# Altium footprint library Wurth_Elektronik_Electromechanic_Wire_to_Board_Connectors_rev16a.PCBLIB: 662 footprints (part 6 of 42)
Each footprint in its own frame and in the unit in brackets; x right, y up, seen from the top. Pads: shape width x height; smd on the part's side, far side on the other; paste and mask are expansions set on the pad; w line width, h text height; cw(c..) or ccw(c..) is an arc to the next point about the centre after c.
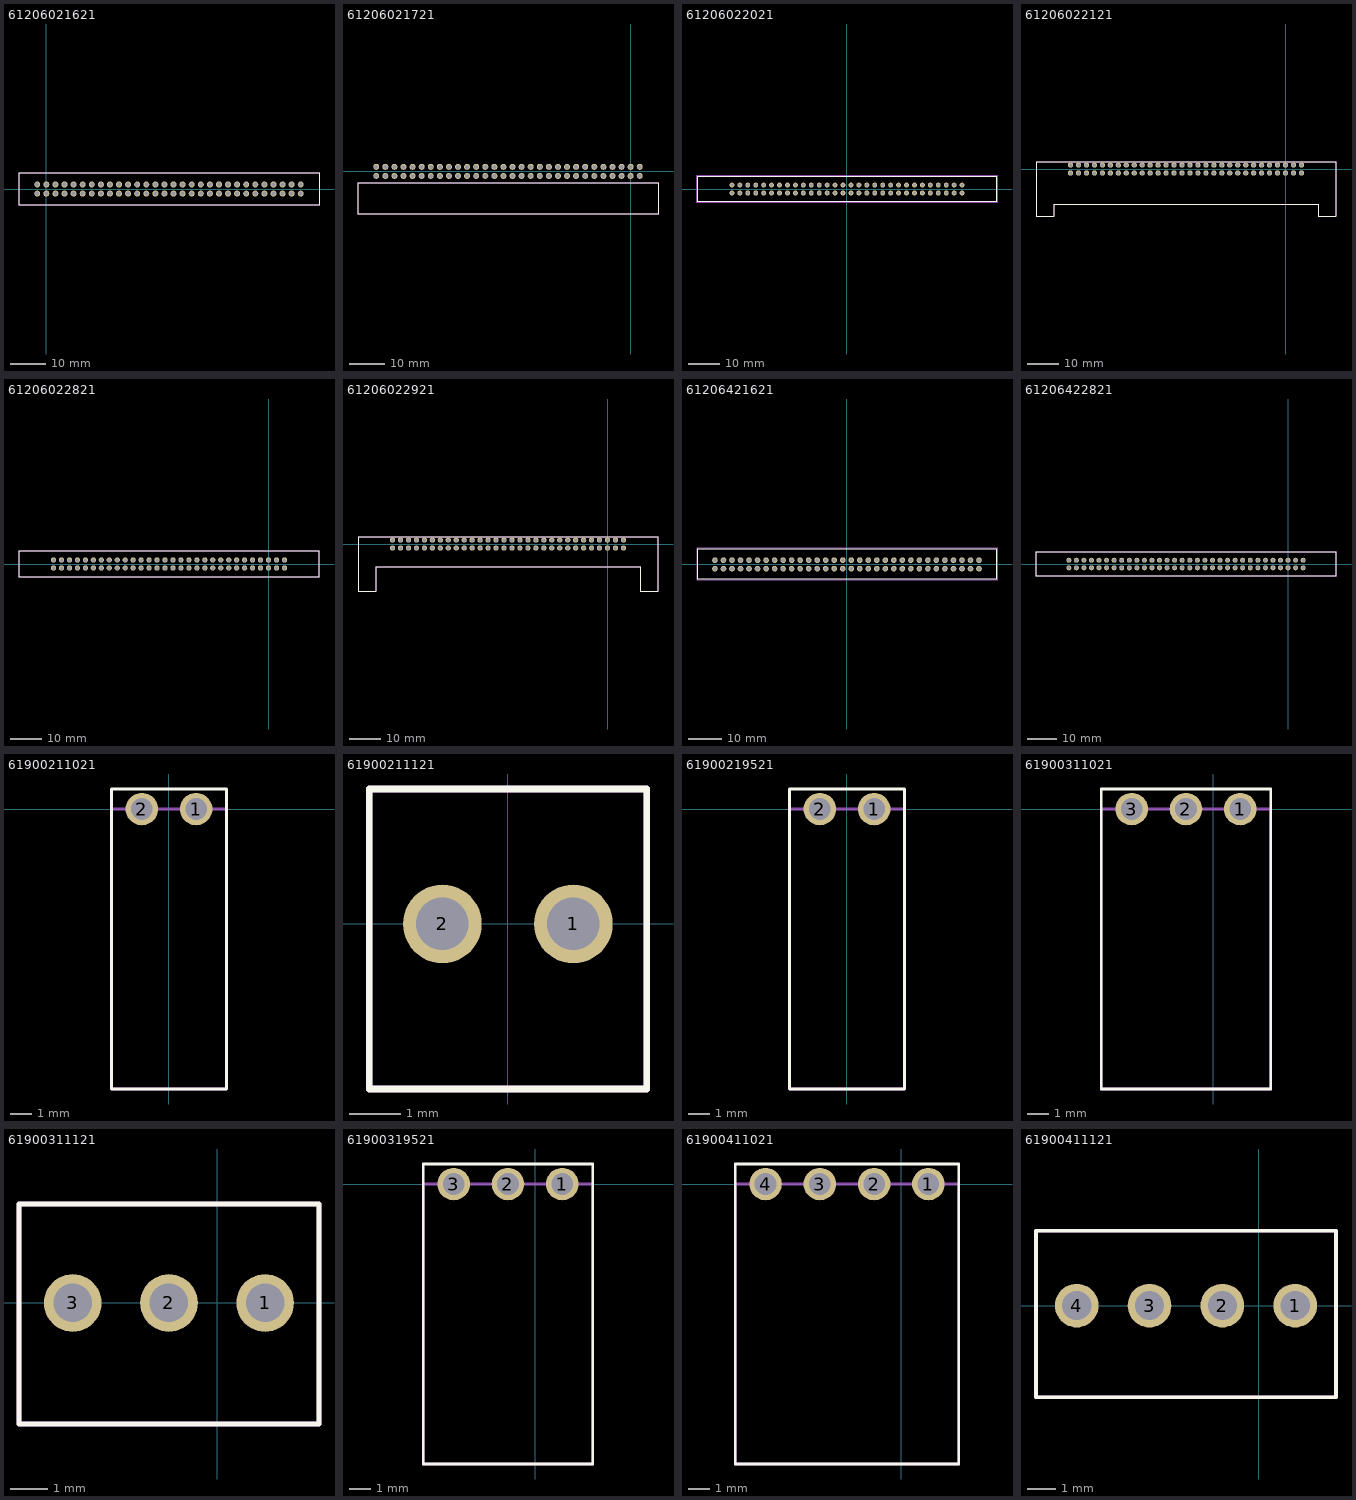
[diagram p5: the footprints below, top view; thin cyan lines are the x and y axes]

## 61206021621 [mil]
pads (60):
  round 66 hole 44: 1(-100,-50) 2(-100,50) 3(0,-50) 4(0,50) 5(100,-50) 6(100,50) 7(200,-50) 8(200,50) 9(300,-50) 10(300,50) 11(400,-50) 12(400,50) 13(500,-50) 14(500,50) 15(600,-50) 16(600,50) 17(700,-50) 18(700,50) 19(800,-50) 20(800,50) 21(900,-50) 22(900,50) 23(1000,-50) 24(1000,50) 25(1100,-50) 26(1100,50) 27(1200,-50) 28(1200,50) 29(1300,-50) 30(1300,50) 31(1400,-50) 32(1400,50) 33(1500,-50) 34(1500,50) 35(1600,-50) 36(1600,50) 37(1700,-50) 38(1700,50) 39(1800,-50) 40(1800,50) 41(1900,-50) 42(1900,50) 43(2000,-50) 44(2000,50) 45(2100,-50) 46(2100,50) 47(2200,-50) 48(2200,50) 49(2300,-50) 50(2300,50) 51(2400,-50) 52(2400,50) 53(2500,-50) 54(2500,50) 55(2600,-50) 56(2600,50) 57(2700,-50) 58(2700,50) 59(2800,-50) 60(2800,50)
Top Overlay:
  lines w5: -300.79,-179.13 3001,-179.13 3001,180 -300.79,180 -300.79,-179.13
Mechanical 2:
  text ">NAME" at 1350,200 h77.5
Mechanical 4:
  text ">VALUE" at 1325,-250 h77.5
Mechanical 16:
  lines w5: -300.79,-179.13 3001,-179.13 3001,180 -300.79,180 -300.79,-179.13
  text "1" at -125,-75 h77.5
  text "60" at 2757,22 h77.5

## 61206021721 [mil]
pads (60):
  round 66 hole 44: 1(100,50) 2(100,-50) 3(0,50) 4(0,-50) 5(-100,50) 6(-100,-50) 7(-200,50) 8(-200,-50) 9(-300,50) 10(-300,-50) 11(-400,50) 12(-400,-50) 13(-500,50) 14(-500,-50) 15(-600,50) 16(-600,-50) 17(-700,50) 18(-700,-50) 19(-800,50) 20(-800,-50) 21(-900,50) 22(-900,-50) 23(-1000,50) 24(-1000,-50) 25(-1100,50) 26(-1100,-50) 27(-1200,50) 28(-1200,-50) 29(-1300,50) 30(-1300,-50) 31(-1400,50) 32(-1400,-50) 33(-1500,50) 34(-1500,-50) 35(-1600,50) 36(-1600,-50) 37(-1700,50) 38(-1700,-50) 39(-1800,50) 40(-1800,-50) 41(-1900,50) 42(-1900,-50) 43(-2000,50) 44(-2000,-50) 45(-2100,50) 46(-2100,-50) 47(-2200,50) 48(-2200,-50) 49(-2300,50) 50(-2300,-50) 51(-2400,50) 52(-2400,-50) 53(-2500,50) 54(-2500,-50) 55(-2600,50) 56(-2600,-50) 57(-2700,50) 58(-2700,-50) 59(-2800,50) 60(-2800,-50)
Top Overlay:
  lines w5: -3000.79,-470.87 301,-470.87 301,-122.44 -3000.79,-122.44 -3000.79,-470.87
Mechanical 2:
  text ">NAME" at 357,-250.7 h77.5
Mechanical 4:
  text ">VALUE" at 357,-348.7 h77.5
Mechanical 16:
  lines w5: -3000.79,-470.87 301,-470.87 301,-122.44 -3000.79,-122.44 -3000.79,-470.87
  text "1" at 75,25 h77.5
  text "60" at -2825,-75 h77.5

## 61206022021 [mil]
pads (60):
  round 61.5 hole 41: 1(1450,50) 2(1450,-50) 3(1350,50) 4(1350,-50) 5(1250,50) 6(1250,-50) 7(1150,50) 8(1150,-50) 9(1050,50) 10(1050,-50) 11(950,50) 12(950,-50) 13(850,50) 14(850,-50) 15(750,50) 16(750,-50) 17(650,50) 18(650,-50) 19(550,50) 20(550,-50) 21(450,50) 22(450,-50) 23(350,50) 24(350,-50) 25(250,50) 26(250,-50) 27(150,50) 28(150,-50) 29(50,50) 30(50,-50) 31(-50,50) 32(-50,-50) 33(-150,50) 34(-150,-50) 35(-250,50) 36(-250,-50) 37(-350,50) 38(-350,-50) 39(-450,50) 40(-450,-50) 41(-550,50) 42(-550,-50) 43(-650,50) 44(-650,-50) 45(-750,50) 46(-750,-50) 47(-850,50) 48(-850,-50) 49(-950,50) 50(-950,-50) 51(-1050,50) 52(-1050,-50) 53(-1150,50) 54(-1150,-50) 55(-1250,50) 56(-1250,-50) 57(-1350,50) 58(-1350,-50) 59(-1450,50) 60(-1450,-50)
Top Overlay:
  lines w5: -1879.92,-163.39 1880,-163.39 1880,164 -1879.92,164 -1879.92,-163.39
Mechanical 2:
  text ">NAME" at 50,200 h77.5
Mechanical 4:
  text ">VALUE" at 50,-250 h77.5
Mechanical 16:
  text "1" at 1425,25 h77.5
  text "60" at -1500,-75 h77.5
  text "2" at 1425,-75 h77.5
Mechanical 27:
  lines w5: -1889.76,-173.23 1890,-173.23 1890,174 -1889.76,174 -1889.76,-173.23

## 61206022121 [mil]
pads (60):
  round 66 hole 44: 1(200,50) 2(200,-50) 3(100,50) 4(100,-50) 5(0,50) 6(0,-50) 7(-100,50) 8(-100,-50) 9(-200,50) 10(-200,-50) 11(-300,50) 12(-300,-50) 13(-400,50) 14(-400,-50) 15(-500,50) 16(-500,-50) 17(-600,50) 18(-600,-50) 19(-700,50) 20(-700,-50) 21(-800,50) 22(-800,-50) 23(-900,50) 24(-900,-50) 25(-1000,50) 26(-1000,-50) 27(-1100,50) 28(-1100,-50) 29(-1200,50) 30(-1200,-50) 31(-1300,50) 32(-1300,-50) 33(-1400,50) 34(-1400,-50) 35(-1500,50) 36(-1500,-50) 37(-1600,50) 38(-1600,-50) 39(-1700,50) 40(-1700,-50) 41(-1800,50) 42(-1800,-50) 43(-1900,50) 44(-1900,-50) 45(-2000,50) 46(-2000,-50) 47(-2100,50) 48(-2100,-50) 49(-2200,50) 50(-2200,-50) 51(-2300,50) 52(-2300,-50) 53(-2400,50) 54(-2400,-50) 55(-2500,50) 56(-2500,-50) 57(-2600,50) 58(-2600,-50) 59(-2700,50) 60(-2700,-50)
Top Overlay:
  lines w5: -3133.86,-590.55 -3133.86,90 634,90 634,-590.55 410,-590.55 410,-440.94 -2909.45,-440.94 -2909.45,-590.55 -3133.86,-590.55
Mechanical 2:
  text ">NAME" at -1200,125 h77.5
Mechanical 4:
  text ">VALUE" at -1211.81,-614.57 h77.5
Mechanical 16:
  lines w5: -3133.86,-590.55 -2909.45,-590.55 -2909.45,-440.94 410,-440.94 410,-590.55 634,-590.55 634,90 -3133.86,90 -3133.86,-590.55
  text "1" at 175,25 h77.5
  text "60" at -2725,-75 h77.5

## 61206022821 [mil]
pads (60):
  round 66 hole 44: 1(200,50) 2(200,-50) 3(100,50) 4(100,-50) 5(0,50) 6(0,-50) 7(-100,50) 8(-100,-50) 9(-200,50) 10(-200,-50) 11(-300,50) 12(-300,-50) 13(-400,50) 14(-400,-50) 15(-500,50) 16(-500,-50) 17(-600,50) 18(-600,-50) 19(-700,50) 20(-700,-50) 21(-800,50) 22(-800,-50) 23(-900,50) 24(-900,-50) 25(-1000,50) 26(-1000,-50) 27(-1100,50) 28(-1100,-50) 29(-1200,50) 30(-1200,-50) 31(-1300,50) 32(-1300,-50) 33(-1400,50) 34(-1400,-50) 35(-1500,50) 36(-1500,-50) 37(-1600,50) 38(-1600,-50) 39(-1700,50) 40(-1700,-50) 41(-1800,50) 42(-1800,-50) 43(-1900,50) 44(-1900,-50) 45(-2000,50) 46(-2000,-50) 47(-2100,50) 48(-2100,-50) 49(-2200,50) 50(-2200,-50) 51(-2300,50) 52(-2300,-50) 53(-2400,50) 54(-2400,-50) 55(-2500,50) 56(-2500,-50) 57(-2600,50) 58(-2600,-50) 59(-2700,50) 60(-2700,-50)
Top Overlay:
  lines w5: -3133.86,-163.39 634,-163.39 634,164 -3133.86,164 -3133.86,-163.39
Mechanical 2:
  text ">NAME" at -1200,200 h77.5
Mechanical 4:
  text ">VALUE" at -1200,-250 h77.5
Mechanical 16:
  lines w5: -3133.86,-163.39 634,-163.39 634,164 -3133.86,164 -3133.86,-163.39
  text "1" at 175,25 h77.5
  text "60" at -2750,-75 h77.5

## 61206022921 [mil]
pads (60):
  round 66 hole 44: 1(200,50) 2(200,-50) 3(100,50) 4(100,-50) 5(0,50) 6(0,-50) 7(-100,50) 8(-100,-50) 9(-200,50) 10(-200,-50) 11(-300,50) 12(-300,-50) 13(-400,50) 14(-400,-50) 15(-500,50) 16(-500,-50) 17(-600,50) 18(-600,-50) 19(-700,50) 20(-700,-50) 21(-800,50) 22(-800,-50) 23(-900,50) 24(-900,-50) 25(-1000,50) 26(-1000,-50) 27(-1100,50) 28(-1100,-50) 29(-1200,50) 30(-1200,-50) 31(-1300,50) 32(-1300,-50) 33(-1400,50) 34(-1400,-50) 35(-1500,50) 36(-1500,-50) 37(-1600,50) 38(-1600,-50) 39(-1700,50) 40(-1700,-50) 41(-1800,50) 42(-1800,-50) 43(-1900,50) 44(-1900,-50) 45(-2000,50) 46(-2000,-50) 47(-2100,50) 48(-2100,-50) 49(-2200,50) 50(-2200,-50) 51(-2300,50) 52(-2300,-50) 53(-2400,50) 54(-2400,-50) 55(-2500,50) 56(-2500,-50) 57(-2600,50) 58(-2600,-50) 59(-2700,50) 60(-2700,-50)
Top Overlay:
  lines w5: -3133.86,-590.16 -3133.86,90 634,90 634,-590.16 410,-590.16 410,-283.46 -2909.45,-283.46 -2909.45,-590.16 -3133.86,-590.16
Mechanical 2:
  text ">NAME" at -1200,125 h77.5
Mechanical 4:
  text ">VALUE" at -1211.81,-457.09 h77.5
Mechanical 16:
  lines w5: -3133.86,-590.16 -2909.45,-590.16 -2909.45,-283.46 410,-283.46 410,-590.16 634,-590.16 634,90 -3133.86,90 -3133.86,-590.16
  text "1" at 175,25 h77.5
  text "60" at -2725,-75 h77.5

## 61206421621 [mil]
pads (64):
  round 66 hole 44: 1(-1550,-50) 2(-1550,50) 3(-1450,-50) 4(-1450,50) 5(-1350,-50) 6(-1350,50) 7(-1250,-50) 8(-1250,50) 9(-1150,-50) 10(-1150,50) 11(-1050,-50) 12(-1050,50) 13(-950,-50) 14(-950,50) 15(-850,-50) 16(-850,50) 17(-750,-50) 18(-750,50) 19(-650,-50) 20(-650,50) 21(-550,-50) 22(-550,50) 23(-450,-50) 24(-450,50) 25(-350,-50) 26(-350,50) 27(-250,-50) 28(-250,50) 29(-150,-50) 30(-150,50) 31(-50,-50) 32(-50,50) 33(50,-50) 34(50,50) 35(150,-50) 36(150,50) 37(250,-50) 38(250,50) 39(350,-50) 40(350,50) 41(450,-50) 42(450,50) 43(550,-50) 44(550,50) 45(650,-50) 46(650,50) 47(750,-50) 48(750,50) 49(850,-50) 50(850,50) 51(950,-50) 52(950,50) 53(1050,-50) 54(1050,50) 55(1150,-50) 56(1150,50) 57(1250,-50) 58(1250,50) 59(1350,-50) 60(1350,50) 61(1450,-50) 62(1450,50) 63(1550,-50) 64(1550,50)
Top Overlay:
  lines w5: -1750.79,-174.21 -1750.79,185 1751,185 1751,-174.21 -1750.79,-174.21
Mechanical 2:
  text ">NAME" at -1750.79,205 h77.5
Mechanical 4:
  text ">VALUE" at -1750.79,-244.21 h77.5
Mechanical 27:
  lines w5: -1760.63,-184.06 -1760.63,194 1761,194 1761,-184.06 -1760.63,-184.06

## 61206422821 [mil]
pads (64):
  round 66 hole 44: 1(200,50) 2(200,-50) 3(100,50) 4(100,-50) 5(0,50) 6(0,-50) 7(-100,50) 8(-100,-50) 9(-200,50) 10(-200,-50) 11(-300,50) 12(-300,-50) 13(-400,50) 14(-400,-50) 15(-500,50) 16(-500,-50) 17(-600,50) 18(-600,-50) 19(-700,50) 20(-700,-50) 21(-800,50) 22(-800,-50) 23(-900,50) 24(-900,-50) 25(-1000,50) 26(-1000,-50) 27(-1100,50) 28(-1100,-50) 29(-1200,50) 30(-1200,-50) 31(-1300,50) 32(-1300,-50) 33(-1400,50) 34(-1400,-50) 35(-1500,50) 36(-1500,-50) 37(-1600,50) 38(-1600,-50) 39(-1700,50) 40(-1700,-50) 41(-1800,50) 42(-1800,-50) 43(-1900,50) 44(-1900,-50) 45(-2000,50) 46(-2000,-50) 47(-2100,50) 48(-2100,-50) 49(-2200,50) 50(-2200,-50) 51(-2300,50) 52(-2300,-50) 53(-2400,50) 54(-2400,-50) 55(-2500,50) 56(-2500,-50) 57(-2600,50) 58(-2600,-50) 59(-2700,50) 60(-2700,-50) 61(-2800,50) 62(-2800,-50) 63(-2900,50) 64(-2900,-50)
Top Overlay:
  lines w5: -3333.86,-163.39 634,-163.39 634,164 -3333.86,164 -3333.86,-163.39
Mechanical 2:
  text ">NAME" at -1200,200 h77.5
Mechanical 4:
  text ">VALUE" at -1200,-250 h77.5
Mechanical 16:
  lines w5: -3333.86,-163.39 634,-163.39 634,164 -3333.86,164 -3333.86,-163.39
  text "1" at 175,25 h77.5
  text "64" at -2925,-75 h77.5

## 61900211021 [mil]
pads (2):
  round 60 hole 40: 1(50,0) 2(-50,0)
Top Overlay:
  lines w5: -105.91,-515.75 106,-515.75 106,37 -105.91,37 -105.91,-515.75
Mechanical 2:
  text ">NAME" at 189,-238.19 h77.5
Mechanical 4:
  text ">VALUE" at 198,-316.14 h77.5
Mechanical 16:
  lines w5: -105.91,-515.75 -105.91,0 106,0 106,-515.75 -105.91,-515.75
  text "1" at 25,-25 h77.5
  text "2" at -75,-25 h77.5

## 61900211121 [mil]
pads (2):
  round 60 hole 40: 1(50,0) 2(-50,0)
Top Overlay:
  lines w5: -105.91,-125.98 106,-125.98 106,103 -105.91,103 -105.91,-125.98
Mechanical 2:
  text ">NAME" at 139,12 h77.5
Mechanical 4:
  text ">VALUE" at 148,-66.14 h77.5
Mechanical 16:
  lines w5: -105.91,-125.98 -105.91,103 106,103 106,-125.98 -105.91,-125.98
  text "1" at 28,-23.62 h77.5
  text "2" at -70.87,-23.62 h77.5

## 61900219521 [mil]
pads (2):
  round 60 hole 40: 1(50,0) 2(-50,0)
Top Overlay:
  lines w5: -105.91,-515.75 106,-515.75 106,37 -105.91,37 -105.91,-515.75
Mechanical 2:
  text ">NAME" at 189,-238.19 h77.5
Mechanical 4:
  text ">VALUE" at 198,-316.14 h77.5
Mechanical 16:
  lines w5: -105.91,-515.75 -105.91,0 106,0 106,-515.75 -105.91,-515.75
  text "1" at 25,-25 h77.5
  text "2" at -75,-25 h77.5

## 61900311021 [mil]
pads (3):
  round 60 hole 40: 1(50,0) 2(-50,0) 3(-150,0)
Top Overlay:
  lines w5: -205.91,-515.75 106,-515.75 106,37 -205.91,37 -205.91,-515.75
Mechanical 2:
  text ">NAME" at 189,-238.19 h77.5
Mechanical 4:
  text ">VALUE" at 198,-316.14 h77.5
Mechanical 16:
  lines w5: -205.91,-515.75 -205.91,0 106,0 106,-515.75 -205.91,-515.75
  text "1" at 25,-25 h77.5
  text "3" at -175,-25 h77.5

## 61900311121 [mil]
pads (3):
  round 60 hole 40: 1(50,0) 2(-50,0) 3(-150,0)
Top Overlay:
  lines w5: -205.91,-125.98 106,-125.98 106,103 -205.91,103 -205.91,-125.98
Mechanical 2:
  text ">NAME" at 139,12 h77.5
Mechanical 4:
  text ">VALUE" at 148,-66.14 h77.5
Mechanical 16:
  lines w5: -205.91,-125.98 -205.91,103 106,103 106,-125.98 -205.91,-125.98
  text "1" at 28,-23.62 h77.5
  text "3" at -169.29,-23.62 h77.5

## 61900319521 [mil]
pads (3):
  round 60 hole 40: 1(50,0) 2(-50,0) 3(-150,0)
Top Overlay:
  lines w5: -205.91,-515.75 106,-515.75 106,37 -205.91,37 -205.91,-515.75
Mechanical 2:
  text ">NAME" at 189,-238.19 h77.5
Mechanical 4:
  text ">VALUE" at 198,-316.14 h77.5
Mechanical 16:
  lines w5: -205.91,-515.75 -205.91,0 106,0 106,-515.75 -205.91,-515.75
  text "1" at 25,-25 h77.5
  text "3" at -175,-25 h77.5

## 61900411021 [mil]
pads (4):
  round 60 hole 40: 1(50,0) 2(-50,0) 3(-150,0) 4(-250,0)
Top Overlay:
  lines w5: -305.91,-515.75 106,-515.75 106,37 -305.91,37 -305.91,-515.75
Mechanical 2:
  text ">NAME" at 189,-238.19 h77.5
Mechanical 4:
  text ">VALUE" at 198,-316.14 h77.5
Mechanical 16:
  lines w5: -305.91,-515.75 -305.91,0 106,0 106,-515.75 -305.91,-515.75
  text "1" at 25,-25 h77.5
  text "4" at -275,-25 h77.5

## 61900411121 [mil]
pads (4):
  round 60 hole 40: 1(50,0) 2(-50,0) 3(-150,0) 4(-250,0)
Top Overlay:
  lines w5: -305.91,-125.98 106,-125.98 106,103 -305.91,103 -305.91,-125.98
Mechanical 2:
  text ">NAME" at 139,12 h77.5
Mechanical 4:
  text ">VALUE" at 148,-66.14 h77.5
Mechanical 16:
  lines w5: -305.91,-125.98 -305.91,103 106,103 106,-125.98 -305.91,-125.98
  text "1" at 28,-23.62 h77.5
  text "4" at -267.72,-27.56 h77.5